# Altium footprint library UWRT_Footprint_Library_2020.PcbLib: 376 footprints (part 2 of 24)
Each footprint in its own frame and in the unit in brackets; x right, y up, seen from the top. Pads: shape width x height; smd on the part's side, far side on the other; paste and mask are expansions set on the pad; w line width, h text height; cw(c..) or ccw(c..) is an arc to the next point about the centre after c.
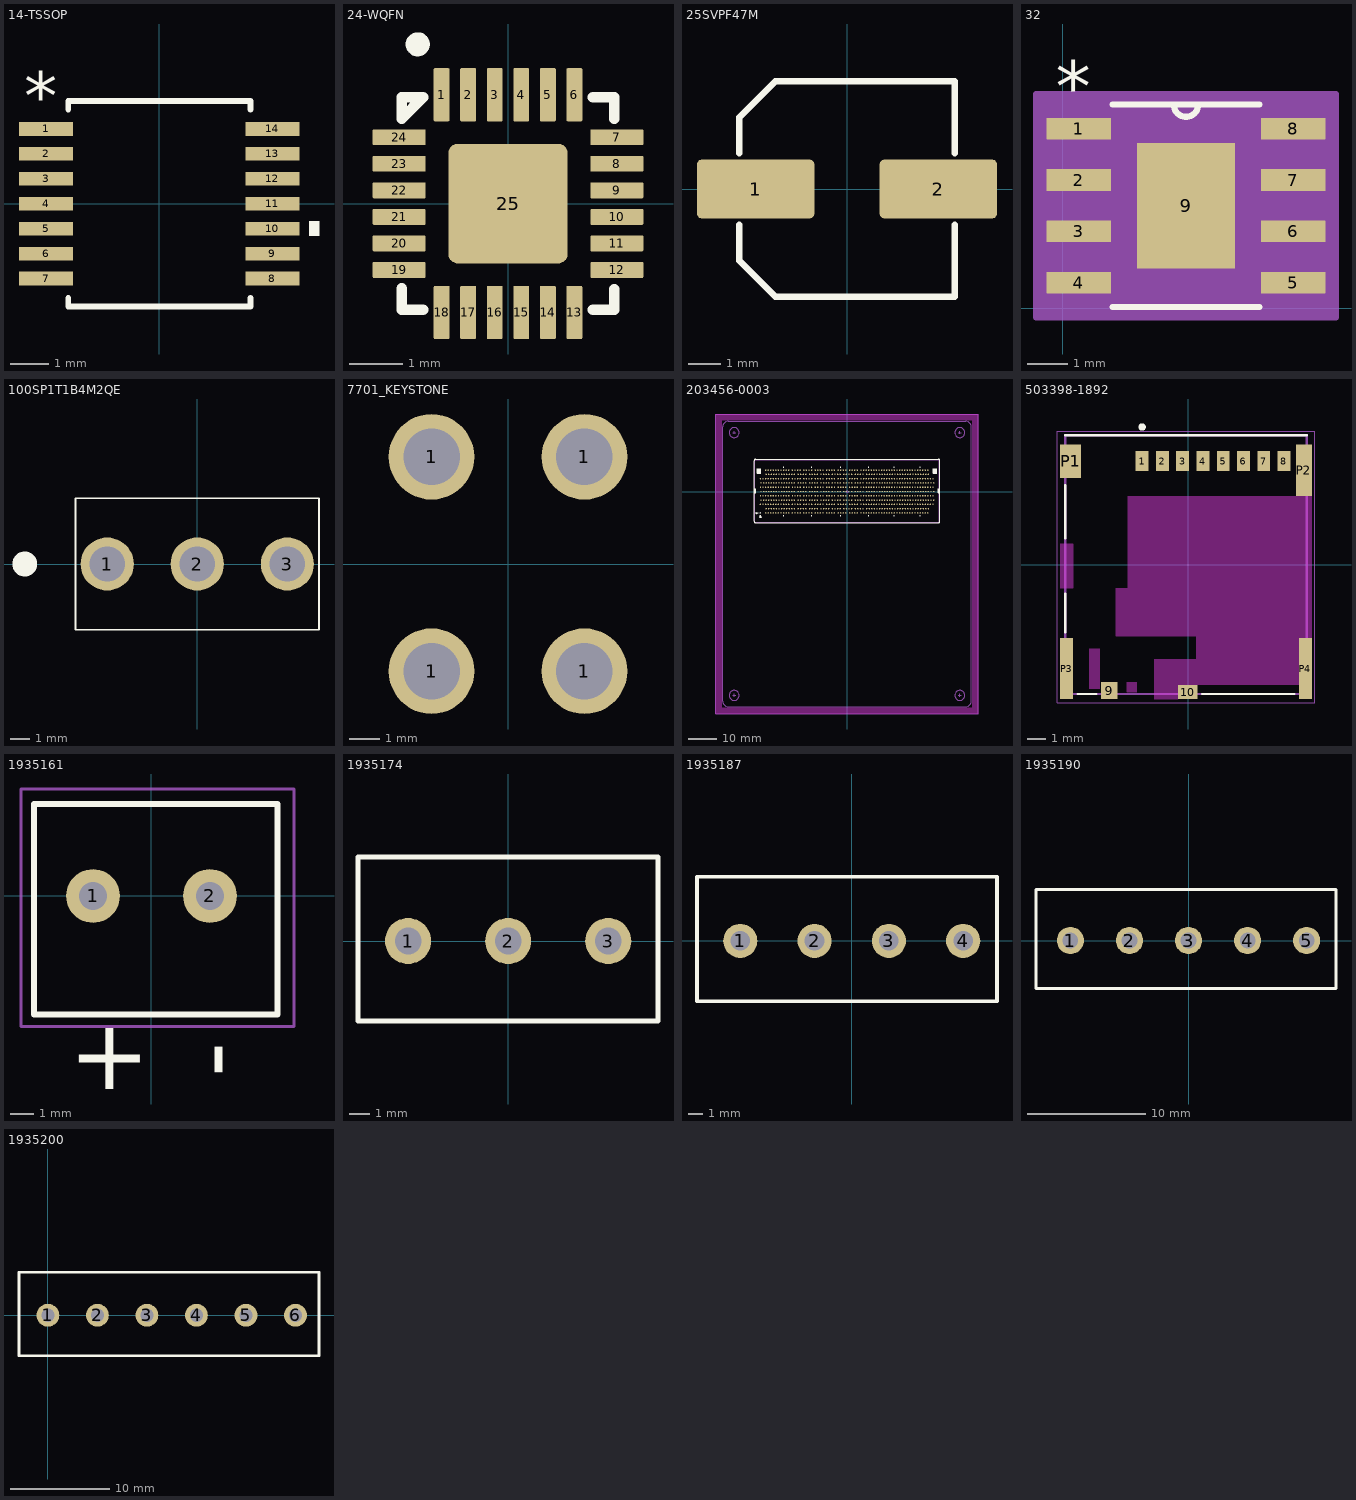
[diagram p1: the footprints below, top view; thin cyan lines are the x and y axes]

## 14-TSSOP [mil]
pads (14):
  rect 55.5x14 smd paste+0 mask+0: 1(-116.25,76.77) 2(-116.25,51.18) 3(-116.25,25.59) 4(-116.25,0) 5(-116.25,-25.59) 6(-116.25,-51.18) 7(-116.25,-76.77) 8(116.25,-76.77) 9(116.25,-51.18) 10(116.25,-25.59) 11(116.25,0) 12(116.25,25.59) 13(116.25,51.18) 14(116.25,76.77)
Top Overlay:
  region: 154,-18.09 164,-18.09 164,-33.09 154,-33.09
  lines w6: -93.5,-96.87 -93.5,-105.5 93.5,-105.5 93.5,-96.87 ; -93.5,96.87 -93.5,105.5 93.5,105.5 93.5,96.87
  text "*" at -138.75,85.77 h50
3D body "SQFN48_7X7_Y9X_MCH.step": height 39.09, standoff 0, extent -137.99,-137.99 137.99,137.99

## 17V_3D_BODY_TEST [mm]
3D body "48-17V Buck Converter.step": height 62, standoff 0.85, extent -23.241,-0.254 29.083,15.736

## 17V_3D_MODEL [mm]
3D body "48-17V Buck Converter.step": height 44.13, standoff 0.06, extent -26.277,-7.741 27.051,8.249

## 24-WQFN [mm]
pads (25):
  rrect15% 0.3x1 smd: 1(-1.25,2.05) 2(-0.75,2.05) 3(-0.25,2.05) 4(0.25,2.05) 5(0.75,2.05) 6(1.25,2.05) 13(1.25,-2.05) 14(0.75,-2.05) 15(0.25,-2.05) 16(-0.25,-2.05) 17(-0.75,-2.05) 18(-1.25,-2.05)
  rrect15% 1x0.3 smd: 7(2.05,1.25) 8(2.05,0.75) 9(2.05,0.25) 10(2.05,-0.25) 11(2.05,-0.75) 12(2.05,-1.25) 19(-2.05,-1.25) 20(-2.05,-0.75) 21(-2.05,-0.25) 22(-2.05,0.25) 23(-2.05,0.75) 24(-2.05,1.25)
  rrect15% 2.25x2.25 smd: 25(0,0)
Top Overlay:
  circle w0.254: c-1.7,3 r0.1
  lines w0.2: -2,-1.6 -2,-2 -1.6,-2 ; 1.6,-2 1.999,-2 1.999,-1.611 ; 1.6,2 2,2 2,1.6 ; -2,1.6 -1.6,2 -2,2 -2,1.6
3D body "WQFN-24.step": height 0.9, standoff 0, extent -2.002,-2.002 2.002,2.002

## 25SVPF47M [mm] "Aluminum Electrolytic Capacitor, Body 6.60x6.60x6.10mm, IPC Low Density"
height 6.1
pads (2):
  rrect15% 3.6x1.8 smd: 1(-2.8,0) 2(2.8,0)
Top Overlay:
  lines w0.2: -3.3,-1.1 -3.3,-2.2 -2.2,-3.3 3.3,-3.3 3.3,-1.1 ; -3.3,1.1 -3.3,2.2 -2.2,3.3 3.3,3.3 3.3,1.1
3D body "6.3 SIZE CODE C6 NEW.STEP": height 5.9, standoff 0, extent -3.65,-3.3 3.65,3.3

## 32 [mil] "233Variable LDO  / 2.25V to 5.5V Input Voltage Range"
pads (9):
  rect 63x21 smd paste-31.5 mask-31.5: 1(15.5,175) 2(15.5,125) 3(15.5,75) 4(15.5,25) 5(224.5,25) 6(224.5,75) 7(224.5,125) 8(224.5,175)
  rect 95x122 smd paste-60.5 mask+0: 9(120,100)
Top Overlay:
  lines w6: 48.62,1.5 191.38,1.5 ; 48.62,198.5 191.38,198.5 ; 108,198.5 ccw(c120,198.5) 132,198.5
  text "*" at -7,191 h50
Top Paste:
  region: 163.56,157.06 76.44,157.06 76.44,103.94 163.56,103.94
  region: 163.56,96.06 76.44,96.06 76.44,42.94 163.56,42.94
Mechanical 13:
  lines w0: 108,198.5 ccw(c120,198.5) 132,198.5
  lines w1: -2,15.5 -2,34.5 41,34.5 41,15.5 -2,15.5 ; -2,65.5 -2,84.5 41,84.5 41,65.5 -2,65.5 ; -2,115.5 -2,134.5 41,134.5 41,115.5 -2,115.5 ; -2,165.5 -2,184.5 41,184.5 41,165.5 -2,165.5 ; 41,1.5 199,1.5 199,198.5 41,198.5 41,1.5 ; 199,15.5 199,34.5 242,34.5 242,15.5 199,15.5 ; 199,65.5 199,84.5 242,84.5 242,65.5 199,65.5 ; 199,115.5 199,134.5 242,134.5 242,115.5 199,115.5 ; 199,165.5 199,184.5 242,184.5 242,165.5 199,165.5
  text "*" at -7,191 h50
Mechanical 15:
  region: 266,-8.5 -26,-8.5 -26,208.5 266,208.5
  lines w6: -26,-8.5 -26,208.5 266,208.5 266,-8.5 -26,-8.5
3D body "MRA08B.step": height 66.1, standoff 0, extent -2.01,1.5 242.01,198.5

## 93AA66AT-I/MS [mm]

## 100SP1T1B4M2QE [mm]
pads (3):
  round 2.775 hole 1.85: 1(-4.7,0) 2(0,0) 3(4.7,0)
Top Overlay:
  circle w0.7: c-9,0 r0.3
  lines w0.1: -6.35,-3.43 6.35,-3.43 6.35,3.43 -6.35,3.43 -6.35,-3.43
3D body "Switch_2.stp": height 29.63, standoff -5.15, extent -6.35,-3.43 6.35,3.43

## 7701_KEYSTONE [mm] "Through hole screw terminal footprint"
pads (4):
  round 2.8 hole 1.85: 1(-2.5,-3.505) 1(-2.5,3.505) 1(2.5,-3.505) 1(2.5,3.505)
3D body "User Library-Keystone_7693.STEP": height 8.2, standoff -5.1, extent -4.008,-4.635 3.992,4.49

## 203456-0003 [mm]
pads (700):
  round 0.5 smd: A3(-28.6,-7.5) A4(-27.7,-7.5) A5(-26.8,-7.5) A6(-25.9,-7.5) A7(-25,-7.5) A8(-24.1,-7.5) A9(-23.2,-7.5) A10(-22.3,-7.5) A11(-21.4,-7.5) A12(-20.5,-7.5) A13(-19.2,-7.5) A14(-18.3,-7.5) A15(-17.4,-7.5) A16(-16.5,-7.5) A17(-15.2,-7.5) A18(-14.3,-7.5) A19(-13.4,-7.5) A20(-12.5,-7.5) A21(-11.2,-7.5) A22(-10.3,-7.5) A23(-9.4,-7.5) A24(-8.5,-7.5) A25(-7.2,-7.5) A26(-6.3,-7.5) A27(-5.4,-7.5) A28(-4.5,-7.5) A29(-3.2,-7.5) A30(-2.3,-7.5) A31(-1.4,-7.5) A32(-0.5,-7.5) A33(0.8,-7.5) A34(1.7,-7.5) A35(2.6,-7.5) A36(3.5,-7.5) A37(4.8,-7.5) A38(5.7,-7.5) A39(6.6,-7.5) A40(7.5,-7.5) A41(8.4,-7.5) A42(9.3,-7.5) A43(10.2,-7.5) A44(11.1,-7.5) A45(12,-7.5) A46(12.9,-7.5) A47(13.8,-7.5) A48(14.7,-7.5) A49(15.6,-7.5) A50(16.5,-7.5) A51(17.4,-7.5) A52(18.3,-7.5) A53(19.2,-7.5) A54(20.1,-7.5) A55(21,-7.5) A56(21.9,-7.5) A57(22.8,-7.5) A58(23.7,-7.5) A59(24.6,-7.5) A60(25.5,-7.5) A61(26.4,-7.5) A62(27.3,-7.5) A63(28.2,-7.5) B3(-28.4,-6) B4(-27.5,-6) B5(-26.6,-6) B6(-25.7,-6) B7(-24.8,-6) B8(-23.9,-6) B9(-23,-6) B10(-22.1,-6) B11(-21.2,-6) B12(-20.3,-6) B13(-19.4,-6) B14(-18.5,-6) B15(-17.2,-6) B16(-16.3,-6) B17(-15.4,-6) B18(-14.5,-6) B19(-13.2,-6) B20(-12.3,-6) B21(-11.4,-6) B22(-10.5,-6) B23(-9.2,-6) B24(-8.3,-6) B25(-7.4,-6) B26(-6.5,-6) B27(-5.2,-6) B28(-4.3,-6) B29(-3.4,-6) B30(-2.5,-6) B31(-1.2,-6) B32(-0.3,-6) B33(0.6,-6) B34(1.5,-6) B35(2.8,-6) B36(3.7,-6) B37(4.6,-6) B38(5.5,-6) B39(6.8,-6) B40(7.7,-6) B41(8.6,-6) B42(9.5,-6) B43(10.4,-6) B44(11.3,-6) B45(12.2,-6) B46(13.1,-6) B47(14,-6) B48(14.9,-6) B49(15.8,-6) B50(16.7,-6) B51(17.6,-6) B52(18.5,-6) B53(19.4,-6) B54(20.3,-6) B55(21.2,-6) B56(22.1,-6) B57(23,-6) B58(23.9,-6) B59(24.8,-6) B60(25.7,-6) B61(26.6,-6) B62(27.5,-6) B63(28.4,-6) C1(-30.4,-4.5) C2(-29.5,-4.5) C3(-28.6,-4.5) C4(-27.7,-4.5) C5(-26.8,-4.5) C6(-25.9,-4.5) C7(-25,-4.5) C8(-24.1,-4.5) C9(-23.2,-4.5) C10(-22.3,-4.5) C11(-21.4,-4.5) C12(-20.5,-4.5) C13(-19.2,-4.5) C14(-18.3,-4.5) C15(-17.4,-4.5) C16(-16.5,-4.5) C17(-15.2,-4.5) C18(-14.3,-4.5) C19(-13.4,-4.5) C20(-12.5,-4.5) C21(-11.2,-4.5) C22(-10.3,-4.5) C23(-9.4,-4.5) C24(-8.5,-4.5) C25(-7.2,-4.5) C26(-6.3,-4.5) C27(-5.4,-4.5) C28(-4.5,-4.5) C29(-3.2,-4.5) C30(-2.3,-4.5) C31(-1.4,-4.5) C32(-0.5,-4.5) C33(0.8,-4.5) C34(1.7,-4.5) C35(2.6,-4.5) C36(3.5,-4.5) C37(4.8,-4.5) C38(5.7,-4.5) C39(6.6,-4.5) C40(7.5,-4.5) C41(8.4,-4.5) C42(9.3,-4.5) C43(10.2,-4.5) C44(11.1,-4.5) C45(12,-4.5) C46(12.9,-4.5) C47(13.8,-4.5) C48(14.7,-4.5) C49(15.6,-4.5) C50(16.5,-4.5) C51(17.4,-4.5) C52(18.3,-4.5) C53(19.2,-4.5) C54(20.1,-4.5) C55(21,-4.5) C56(21.9,-4.5) C57(22.8,-4.5) C58(23.7,-4.5) C59(24.6,-4.5) C60(25.5,-4.5) C61(26.4,-4.5) C62(27.3,-4.5) C63(28.2,-4.5) C64(29.1,-4.5) C65(30,-4.5) D1(-30.2,-3) D2(-29.3,-3) D3(-28.4,-3) D4(-27.5,-3) D5(-26.6,-3) D6(-25.7,-3) D7(-24.8,-3) D8(-23.9,-3) D9(-23,-3) D10(-22.1,-3) D11(-21.2,-3) D12(-20.3,-3) D13(-19.4,-3) D14(-18.5,-3) D15(-17.2,-3) D16(-16.3,-3) D17(-15.4,-3) D18(-14.5,-3) D19(-13.2,-3) D20(-12.3,-3) D21(-11.4,-3) D22(-10.5,-3) D23(-9.2,-3) D24(-8.3,-3) D25(-7.4,-3) D26(-6.5,-3) D27(-5.2,-3) D28(-4.3,-3) D29(-3.4,-3) D30(-2.5,-3) D31(-1.2,-3) D32(-0.3,-3) D33(0.6,-3) D34(1.5,-3) D35(2.8,-3) D36(3.7,-3) D37(4.6,-3) D38(5.5,-3) D39(6.8,-3) D40(7.7,-3) D41(8.6,-3) D42(9.5,-3) D43(10.4,-3) D44(11.3,-3) D45(12.2,-3) D46(13.1,-3) D47(14,-3) D48(14.9,-3) D49(15.8,-3) D50(16.7,-3) D51(17.6,-3) D52(18.5,-3) D53(19.4,-3) D54(20.3,-3) D55(21.2,-3) D56(22.1,-3) D57(23,-3) D58(23.9,-3) D59(24.8,-3) D60(25.7,-3) D61(26.6,-3) D62(27.5,-3) D63(28.4,-3) D64(29.3,-3) D65(30.2,-3) E1(-30.4,-1.5) E2(-29.5,-1.5) E3(-28.6,-1.5) E4(-27.7,-1.5) E5(-26.8,-1.5) E6(-25.9,-1.5) E7(-25,-1.5) E8(-24.1,-1.5) E9(-23.2,-1.5) E10(-22.3,-1.5) E11(-21.4,-1.5) E12(-20.5,-1.5) E13(-19.2,-1.5) E14(-18.3,-1.5) E15(-17.4,-1.5) E16(-16.5,-1.5) E17(-15.2,-1.5) E18(-14.3,-1.5) E19(-13.4,-1.5) E20(-12.5,-1.5) E21(-11.2,-1.5) E22(-10.3,-1.5) E23(-9.4,-1.5) E24(-8.5,-1.5) E25(-7.2,-1.5) E26(-6.3,-1.5) E27(-5.4,-1.5) E28(-4.5,-1.5) E29(-3.2,-1.5) E30(-2.3,-1.5) E31(-1.4,-1.5) E32(-0.5,-1.5) E33(0.8,-1.5) E34(1.7,-1.5) E35(2.6,-1.5) E36(3.5,-1.5) E37(4.8,-1.5) E38(5.7,-1.5) E39(6.6,-1.5) E40(7.5,-1.5) E41(8.4,-1.5) E42(9.3,-1.5) E43(10.2,-1.5) E44(11.1,-1.5) E45(12,-1.5) E46(12.9,-1.5) E47(13.8,-1.5) E48(14.7,-1.5) E49(15.6,-1.5) E50(16.5,-1.5) E51(17.4,-1.5) E52(18.3,-1.5) E53(19.2,-1.5) E54(20.1,-1.5) E55(21,-1.5) E56(21.9,-1.5) E57(22.8,-1.5) E58(23.7,-1.5) E59(24.6,-1.5) E60(25.5,-1.5) E61(26.4,-1.5) E62(27.3,-1.5) E63(28.2,-1.5) E64(29.1,-1.5) E65(30,-1.5) F1(-30.2,0) F2(-29.3,0) F3(-28.4,0) F4(-27.5,0) F5(-26.6,0) F6(-25.7,0) F7(-24.8,0) F8(-23.9,0) F9(-23,0) F10(-22.1,0) F11(-21.2,0) F12(-20.3,0) F13(-19.4,0) F14(-18.5,0) F15(-17.2,0) F16(-16.3,0) F17(-15.4,0) F18(-14.5,0) F19(-13.2,0) F20(-12.3,0) F21(-11.4,0) F22(-10.5,0) F23(-9.2,0) F24(-8.3,0) F25(-7.4,0) F26(-6.5,0) F27(-5.2,0) F28(-4.3,0) F29(-3.4,0) F30(-2.5,0) F31(-1.2,0) F32(-0.3,0) F33(0.6,0) F34(1.5,0) F35(2.8,0) F36(3.7,0) F37(4.6,0) F38(5.5,0) F39(6.8,0) F40(7.7,0) F41(8.6,0) F42(9.5,0) F43(10.4,0) F44(11.3,0) F45(12.2,0) F46(13.1,0) F47(14,0) F48(14.9,0) F49(15.8,0) F50(16.7,0) F51(17.6,0) F52(18.5,0) F53(19.4,0) F54(20.3,0) F55(21.2,0) F56(22.1,0) F57(23,0) F58(23.9,0) F59(24.8,0) F60(25.7,0) F61(26.6,0) F62(27.5,0) F63(28.4,0) F64(29.3,0) F65(30.2,0) G1(-30.4,1.5) G2(-29.5,1.5) G3(-28.6,1.5) G4(-27.7,1.5) G5(-26.8,1.5) G6(-25.9,1.5) G7(-25,1.5) G8(-24.1,1.5) G9(-23.2,1.5) G10(-22.3,1.5) G11(-21.4,1.5) G12(-20.5,1.5) G13(-19.2,1.5) G14(-18.3,1.5) G15(-17.4,1.5) G16(-16.5,1.5) G17(-15.2,1.5) G18(-14.3,1.5) G19(-13.4,1.5) G20(-12.5,1.5) G21(-11.2,1.5) G22(-10.3,1.5) G23(-9.4,1.5) G24(-8.5,1.5) G25(-7.2,1.5) G26(-6.3,1.5) G27(-5.4,1.5) G28(-4.5,1.5) G29(-3.2,1.5) G30(-2.3,1.5) G31(-1.4,1.5) G32(-0.5,1.5) G33(0.8,1.5) G34(1.7,1.5) G35(2.6,1.5) G36(3.5,1.5) G37(4.8,1.5) G38(5.7,1.5) G39(6.6,1.5) G40(7.5,1.5) G41(8.4,1.5) G42(9.3,1.5) G43(10.2,1.5) G44(11.1,1.5) G45(12,1.5) G46(12.9,1.5) G47(13.8,1.5) G48(14.7,1.5) G49(15.6,1.5) G50(16.5,1.5) G51(17.4,1.5) G52(18.3,1.5) G53(19.2,1.5) G54(20.1,1.5) G55(21,1.5) G56(21.9,1.5) G57(22.8,1.5) G58(23.7,1.5) G59(24.6,1.5) G60(25.5,1.5) G61(26.4,1.5) G62(27.3,1.5) G63(28.2,1.5) G64(29.1,1.5) G65(30,1.5) H1(-30.2,3) H2(-29.3,3) H3(-28.4,3) H4(-27.5,3) H5(-26.6,3) H6(-25.7,3) H7(-24.8,3) H8(-23.9,3) H9(-23,3) H10(-22.1,3) H11(-21.2,3) H12(-20.3,3) H13(-19.4,3) H14(-18.5,3) H15(-17.2,3) H16(-16.3,3) H17(-15.4,3) H18(-14.5,3) H19(-13.2,3) H20(-12.3,3) H21(-11.4,3) H22(-10.5,3) H23(-9.2,3) H24(-8.3,3) H25(-7.4,3) H26(-6.5,3) H27(-5.2,3) H28(-4.3,3) H29(-3.4,3) H30(-2.5,3) H31(-1.2,3) H32(-0.3,3) H33(0.6,3) H34(1.5,3) H35(2.8,3) H36(3.7,3) H37(4.6,3) H38(5.5,3) H39(6.8,3) H40(7.7,3) H41(8.6,3) H42(9.5,3) H43(10.4,3) H44(11.3,3) H45(12.2,3) H46(13.1,3) H47(14,3) H48(14.9,3) H49(15.8,3) H50(16.7,3) H51(17.6,3) H52(18.5,3) H53(19.4,3) H54(20.3,3) H55(21.2,3) H56(22.1,3) H57(23,3) H58(23.9,3) H59(24.8,3) H60(25.7,3) H61(26.6,3) H62(27.5,3) H63(28.4,3) H64(29.3,3) H65(30.2,3) J1(-30.4,4.5) J2(-29.5,4.5) J3(-28.6,4.5) J4(-27.7,4.5) J5(-26.8,4.5) J6(-25.9,4.5) J7(-25,4.5) J8(-24.1,4.5) J9(-23.2,4.5) J10(-22.3,4.5) J11(-21.4,4.5) J12(-20.5,4.5) J13(-19.2,4.5) J14(-18.3,4.5) J15(-17.4,4.5) J16(-16.5,4.5) J17(-15.2,4.5) J18(-14.3,4.5) J19(-13.4,4.5) J20(-12.5,4.5) J21(-11.2,4.5) J22(-10.3,4.5) J23(-9.4,4.5) J24(-8.5,4.5) J25(-7.2,4.5) J26(-6.3,4.5) J27(-5.4,4.5) J28(-4.5,4.5) J29(-3.2,4.5) J30(-2.3,4.5) J31(-1.4,4.5) J32(-0.5,4.5) J33(0.8,4.5) J34(1.7,4.5) J35(2.6,4.5) J36(3.5,4.5) J37(4.8,4.5) J38(5.7,4.5) J39(6.6,4.5) J40(7.5,4.5) J41(8.4,4.5) J42(9.3,4.5) J43(10.2,4.5) J44(11.1,4.5) J45(12,4.5) J46(12.9,4.5) J47(13.8,4.5) J48(14.7,4.5) J49(15.6,4.5) J50(16.5,4.5) J51(17.4,4.5) J52(18.3,4.5) J53(19.2,4.5) J54(20.1,4.5) J55(21,4.5) J56(21.9,4.5) J57(22.8,4.5) J58(23.7,4.5) J59(24.6,4.5) J60(25.5,4.5) J61(26.4,4.5) J62(27.3,4.5) J63(28.2,4.5) J64(29.1,4.5) J65(30,4.5) K3(-28.4,6) K4(-27.5,6) K5(-26.6,6) K6(-25.7,6) K7(-24.8,6) K8(-23.9,6) K9(-23,6) K10(-22.1,6) K11(-21.2,6) K12(-20.3,6) K13(-19.4,6) K14(-18.5,6) K15(-17.2,6) K16(-16.3,6) K17(-15.4,6) K18(-14.5,6) K19(-13.2,6) K20(-12.3,6) K21(-11.4,6) K22(-10.5,6) K23(-9.2,6) K24(-8.3,6) K25(-7.4,6) K26(-6.5,6) K27(-5.2,6) K28(-4.3,6) K29(-3.4,6) K30(-2.5,6) K31(-1.2,6) K32(-0.3,6) K33(0.6,6) K34(1.5,6) K35(2.8,6) K36(3.7,6) K37(4.6,6) K38(5.5,6) K39(6.8,6) K40(7.7,6) K41(8.6,6) K42(9.5,6) K43(10.4,6) K44(11.3,6) K45(12.2,6) K46(13.1,6) K47(14,6) K48(14.9,6) K49(15.8,6) K50(16.7,6) K51(17.6,6) K52(18.5,6) K53(19.4,6) K54(20.3,6) K55(21.2,6) K56(22.1,6) K57(23,6) K58(23.9,6) K59(24.8,6) K60(25.7,6) K61(26.6,6) K62(27.5,6) K63(28.4,6) L3(-28.6,7.5) L4(-27.7,7.5) L5(-26.8,7.5) L6(-25.9,7.5) L7(-25,7.5) L8(-24.1,7.5) L9(-23.2,7.5) L10(-22.3,7.5) L11(-21.4,7.5) L12(-20.5,7.5) L13(-19.2,7.5) L14(-18.3,7.5) L15(-17.4,7.5) L16(-16.5,7.5) L17(-15.2,7.5) L18(-14.3,7.5) L19(-13.4,7.5) L20(-12.5,7.5) L21(-11.2,7.5) L22(-10.3,7.5) L23(-9.4,7.5) L24(-8.5,7.5) L25(-7.2,7.5) L26(-6.3,7.5) L27(-5.4,7.5) L28(-4.5,7.5) L29(-3.2,7.5) L30(-2.3,7.5) L31(-1.4,7.5) L32(-0.5,7.5) L33(0.8,7.5) L34(1.7,7.5) L35(2.6,7.5) L36(3.5,7.5) L37(4.8,7.5) L38(5.7,7.5) L39(6.6,7.5) L40(7.5,7.5) L41(8.4,7.5) L42(9.3,7.5) L43(10.2,7.5) L44(11.1,7.5) L45(12,7.5) L46(12.9,7.5) L47(13.8,7.5) L48(14.7,7.5) L49(15.6,7.5) L50(16.5,7.5) L51(17.4,7.5) L52(18.3,7.5) L53(19.2,7.5) L54(20.1,7.5) L55(21,7.5) L56(21.9,7.5) L57(22.8,7.5) L58(23.7,7.5) L59(24.6,7.5) L60(25.5,7.5) L61(26.4,7.5) L62(27.3,7.5) L63(28.2,7.5)
  round 0.5 on Top Overlay: ""(-30.4,-7.5)
Top Layer keep-out:
  region: 43.7,-75.665 43.7,24.935 -43.9,24.935 -43.9,-75.665 43.7,-75.665 45.9,-77.865 -46.1,-77.865 -46.1,27.135 45.9,27.135 45.9,-77.865
Top Overlay:
  rectangle: 30.156,6.406 31.25,7.969
  region: -30.356,7.969 -31.45,7.969 -31.45,6.406 -30.356,6.406
  rectangle: 31.875,-0.469 32.406,0.937
  region: -32.075,0.937 -32.606,0.937 -32.606,-0.469 -32.075,-0.469
  region: -30.4,-8.301 -30.718,-8.936 -30.083,-8.936
  region: -31.201,-7.5 -31.836,-7.182 -31.836,-7.817
  lines w0.125: -22.3,-8.619 -22.3,-8.301 ; -22.3,8.301 -22.3,8.619 ; -12.5,-8.619 -12.5,-8.301 ; -12.5,8.301 -12.5,8.619 ; -2.3,-8.619 -2.3,-8.301 ; -2.3,8.301 -2.3,8.619 ; 7.5,-8.619 7.5,-8.301 ; 7.5,8.301 7.5,8.619 ; 16.5,-8.619 16.5,-8.301 ; 16.5,8.301 16.5,8.619 ; 25.5,-8.619 25.5,-8.301 ; 25.5,8.301 25.5,8.619
  lines w0.19: -32.606,-0.469 -32.075,-0.469 -32.075,0.937 -32.606,0.937 ; 32.406,-0.469 31.875,-0.469 31.875,0.937 32.406,0.937 ; -32.606,-10.423 ccw(c-32.073,-10.423) -32.073,-10.956 31.873,-10.956 ccw(c31.873,-10.423) 32.406,-10.423 32.406,10.823 ccw(c31.873,10.823) 31.873,11.356 -32.073,11.356 ccw(c-32.073,10.823) -32.606,10.823 -32.606,-10.423 ; -31.45,6.406 -30.356,6.406 -30.356,7.969 -31.45,7.969 -31.45,6.406 ; 30.156,6.406 31.25,6.406 31.25,7.969 30.156,7.969 30.156,6.406
  lines w0.191: -31.836,-7.817 -31.836,-7.182 -31.201,-7.5 -31.836,-7.817 ; -30.718,-8.936 -30.4,-8.301 -30.083,-8.936 -30.718,-8.936
Mechanical 1:
  circle w0.125: c-39.6,-71.365 r1.75
  circle w0.125: c39.4,-71.365 r1.75
  circle w0.125: c-39.6,20.635 r1.75
  circle w0.125: c39.4,20.635 r1.75
  lines w0.125: -40.1,-71.365 -39.1,-71.365 ; -40.1,20.635 -39.1,20.635 ; -39.6,-71.865 -39.6,-70.865 ; -39.6,20.135 -39.6,21.135 ; 38.9,-71.365 39.9,-71.365 ; 38.9,20.635 39.9,20.635 ; 39.4,-71.865 39.4,-70.865 ; 39.4,20.135 39.4,21.135
Mechanical 2:
  circle w0.125: c39.4,-71.365 r1.75
  circle w0.125: c-39.6,-71.365 r1.75
  circle w0.125: c39.4,20.635 r1.75
  circle w0.125: c-39.6,20.635 r1.75
  lines w0.125: -40.1,-71.365 -39.1,-71.365 ; -40.1,20.635 -39.1,20.635 ; -39.6,-71.865 -39.6,-70.865 ; -39.6,20.135 -39.6,21.135 ; 38.9,-71.365 39.9,-71.365 ; 38.9,20.635 39.9,20.635 ; 39.4,-71.865 39.4,-70.865 ; 39.4,20.135 39.4,21.135 ; -43.6,-73.365 ccw(c-41.6,-73.365) -41.6,-75.365 41.4,-75.365 ccw(c41.4,-73.365) 43.4,-73.365 43.4,22.635 ccw(c41.4,22.635) 41.4,24.635 -41.6,24.635 ccw(c-41.6,22.635) -43.6,22.635 -43.6,-73.365
  text "NVIDIA Jetson Xavier AGX Module (Production)" at -42.35,-74.115 h1.52
  text "NVIDIA Jetson Xavier AGX Module (Production)" at 42.15,-74.115 h1.52
  text "NVIDIA Jetson Xavier AGX Module (Production)" at 42.15,23.385 h1.52
  text "NVIDIA Jetson Xavier AGX Module (Production)" at -42.35,23.385 h1.52
Mechanical 3:
  circle w0.125: c-39.6,-71.365 r1.75
  circle w0.125: c39.4,-71.365 r1.75
  circle w0.125: c39.4,20.635 r1.75
  circle w0.125: c-39.6,20.635 r1.75
  lines w0.125: -40.1,-71.365 -39.1,-71.365 ; -40.1,20.635 -39.1,20.635 ; -39.6,-71.865 -39.6,-70.865 ; -39.6,20.135 -39.6,21.135 ; 38.9,-71.365 39.9,-71.365 ; 38.9,20.635 39.9,20.635 ; 39.4,-71.865 39.4,-70.865 ; 39.4,20.135 39.4,21.135 ; -46.1,-77.865 -46.1,27.135 45.9,27.135 45.9,-77.865 -46.1,-77.865
  text "NVIDIA Jetson Xavier AGX Module (Dev Kit)" at -43.6,24.635 h1.52
  text "NVIDIA Jetson Xavier AGX Module (Dev Kit)" at 43.4,-75.365 h1.52
  text "NVIDIA Jetson Xavier AGX Module (Dev Kit)" at 43.4,24.635 h1.52
  text "NVIDIA Jetson Xavier AGX Module (Dev Kit)" at -43.6,-75.365 h1.52
Route Tool Path:
  lines w0.064: -32.45,-10.8 -32.45,11.2 32.25,11.2 32.25,-10.8 -32.45,-10.8
Mechanical 15:
  lines w0.125: -0.5,0 0.5,0 ; 0,-0.5 0,0.5 ; -46.1,-77.865 -46.1,27.135 45.9,27.135 45.9,-77.865 -46.1,-77.865
3D body "2034560003.stp": height 7.66, standoff -0.25, extent -32.45,-10.8 32.25,11.2

## 503398-1892 [mm] "12 (9 + 3) Position Card Connector Secure Digital - SD Surface Mount, Right Angle Gold"
pads (14):
  rect 0.7x1.1 smd: 1(-2.507,5.625) 2(-1.407,5.625) 3(-0.307,5.625) 4(0.793,5.625) 5(1.893,5.625) 6(2.993,5.625) 7(4.093,5.625) 8(5.193,5.625)
  rect 0.9x0.93 smd: 9(-4.297,-6.84)
  rect 1.05x0.78 smd: 10(-0.032,-6.915)
  rect 1.14x1.83 smd: P1(-6.387,5.61)
  rect 0.86x2.8 smd: P2(6.273,5.125)
  rect 0.7x3.33 smd: P3(-6.607,-5.64) P4(6.353,-5.64)
Top Overlay:
  circle w0.2: c-2.507,7.475 r0.1
  lines w0.127: -6.677,-3.675 -6.677,-1.575 ; -6.677,1.425 -6.677,4.325 ; -6.677,7.025 6.423,7.025 ; -6.003,-7.025 -5.001,-7.025 ; 0.747,-7.025 5.749,-7.025
Keep-Out Layer:
  region: -2.797,-6.93 -3.35,-6.93 -3.35,-6.375 -2.797,-6.375
  region: -4.812,-6.738 -5.372,-6.738 -5.372,-4.575 -4.812,-4.575
  region: -6.257,-1.276 -6.963,-1.276 -6.963,1.125 -6.257,1.125
  region: 6.703,-3.975 6.003,-3.975 6.003,-6.525 -0.557,-6.525 -0.557,-7.305 -1.857,-7.305 -1.857,-5.125 0.443,-5.125 0.443,-3.875 -3.947,-3.875 -3.947,-1.275 -3.297,-1.275 -3.297,3.725 6.703,3.725
Mechanical 13:
  circle w0.2: c-2.507,5.775 r0.1
  lines w0.127: -6.677,-7.025 -6.677,7.025 6.423,7.025 6.423,-7.025 -6.677,-7.025
Mechanical 15:
  lines w0.05: -7.127,-7.5 -7.127,7.25 6.873,7.25 6.873,-7.5 -7.127,-7.5
3D body "step_temp.STEP": height 1.4, standoff 0, extent -6.677,-7.025 6.423,7.045

## 1935161 [mm] "TERM BLK 2POS SIDE ENTRY 5MM PCB"
pads (2):
  round 2.3 hole 1.2: 1(-2.5,0) 2(2.5,0)
Top Overlay:
  lines w0.254: -5.015,-5.062 -5.015,-4.572 -5.015,3.938 4.826,3.938 5.385,3.938 5.385,-5.062 -5.015,-5.062
  text "+" at -3.531,-8.255 h3.05
  text "-" at 4.038,-7.747 h3.05
Mechanical 15:
  lines w0.127: -5.588,-5.588 6.096,-5.588 6.096,4.572 -5.588,4.572 -5.588,-5.588
3D body "1935161--3DModel-STEP-56544.STEP": height 11.41, standoff -3.49, extent -5.015,-5.062 5.385,3.938

## 1935174 [mm] "5 MM PITCH"
height 11.4
pads (3):
  round 2.3 hole 1.325: 1(-5,0) 2(0,0) 3(5,0)
Top Overlay:
  lines w0.254: 7.485,-4 -7.5,-4 -7.5,4.2 7.485,4.2 7.485,-4 ; 7.485,-4 7.485,-4
3D body "pxc_1935174_03_PT-1-5-3-5-0-H_3D.stp": height 11.41, standoff -3.49, extent -8.085,-4 7.485,5

## 1935187 [mm]
height 11.4
pads (4):
  round 2.3 hole 1.325: 1(-7.5,0) 2(-2.5,0) 3(2.5,0) 4(7.5,0)
Top Overlay:
  lines w0.254: -10.414,-4.064 9.777,-4.064 9.777,4.318 -10.414,4.318 -10.414,-4.064
3D body "pxc_1935187_04_PT-1-5-4-5-0-H_3D.stp": height 11.41, standoff -3.49, extent -10.793,-4.064 9.777,4.936

## 1935190 [mm]
pads (5):
  round 2.3 hole 1.325: 1(-10,0) 2(-5,0) 3(0,0) 4(5,0) 5(10,0)
Top Overlay:
  lines w0.254: -12.914,-4.064 12.485,-4.064 12.485,4.318 -12.914,4.318 -12.914,-4.064
3D body "1935190.stp": height 11.41, standoff -3.49, extent -13.1,-4.1 12.47,4.9

## 1935200 [mm]
pads (6):
  round 2.3 hole 1.325: 1(0,0) 2(5,0) 3(10,0) 4(15,0) 5(20,0) 6(25,0)
Top Overlay:
  lines w0.254: -2.914,-4.064 27.374,-4.064 27.374,4.318 -2.914,4.318 -2.914,-4.064
3D body "1935200.stp": height 11.41, standoff -3.49, extent -2.706,-4.445 27.864,4.555